# Altium footprint library PCBfly.PcbLib: 32 footprints (part 2 of 2)
Each footprint in its own frame and in the unit in brackets; x right, y up, seen from the top. Pads: shape width x height; smd on the part's side, far side on the other; paste and mask are expansions set on the pad; w line width, h text height; cw(c..) or ccw(c..) is an arc to the next point about the centre after c.
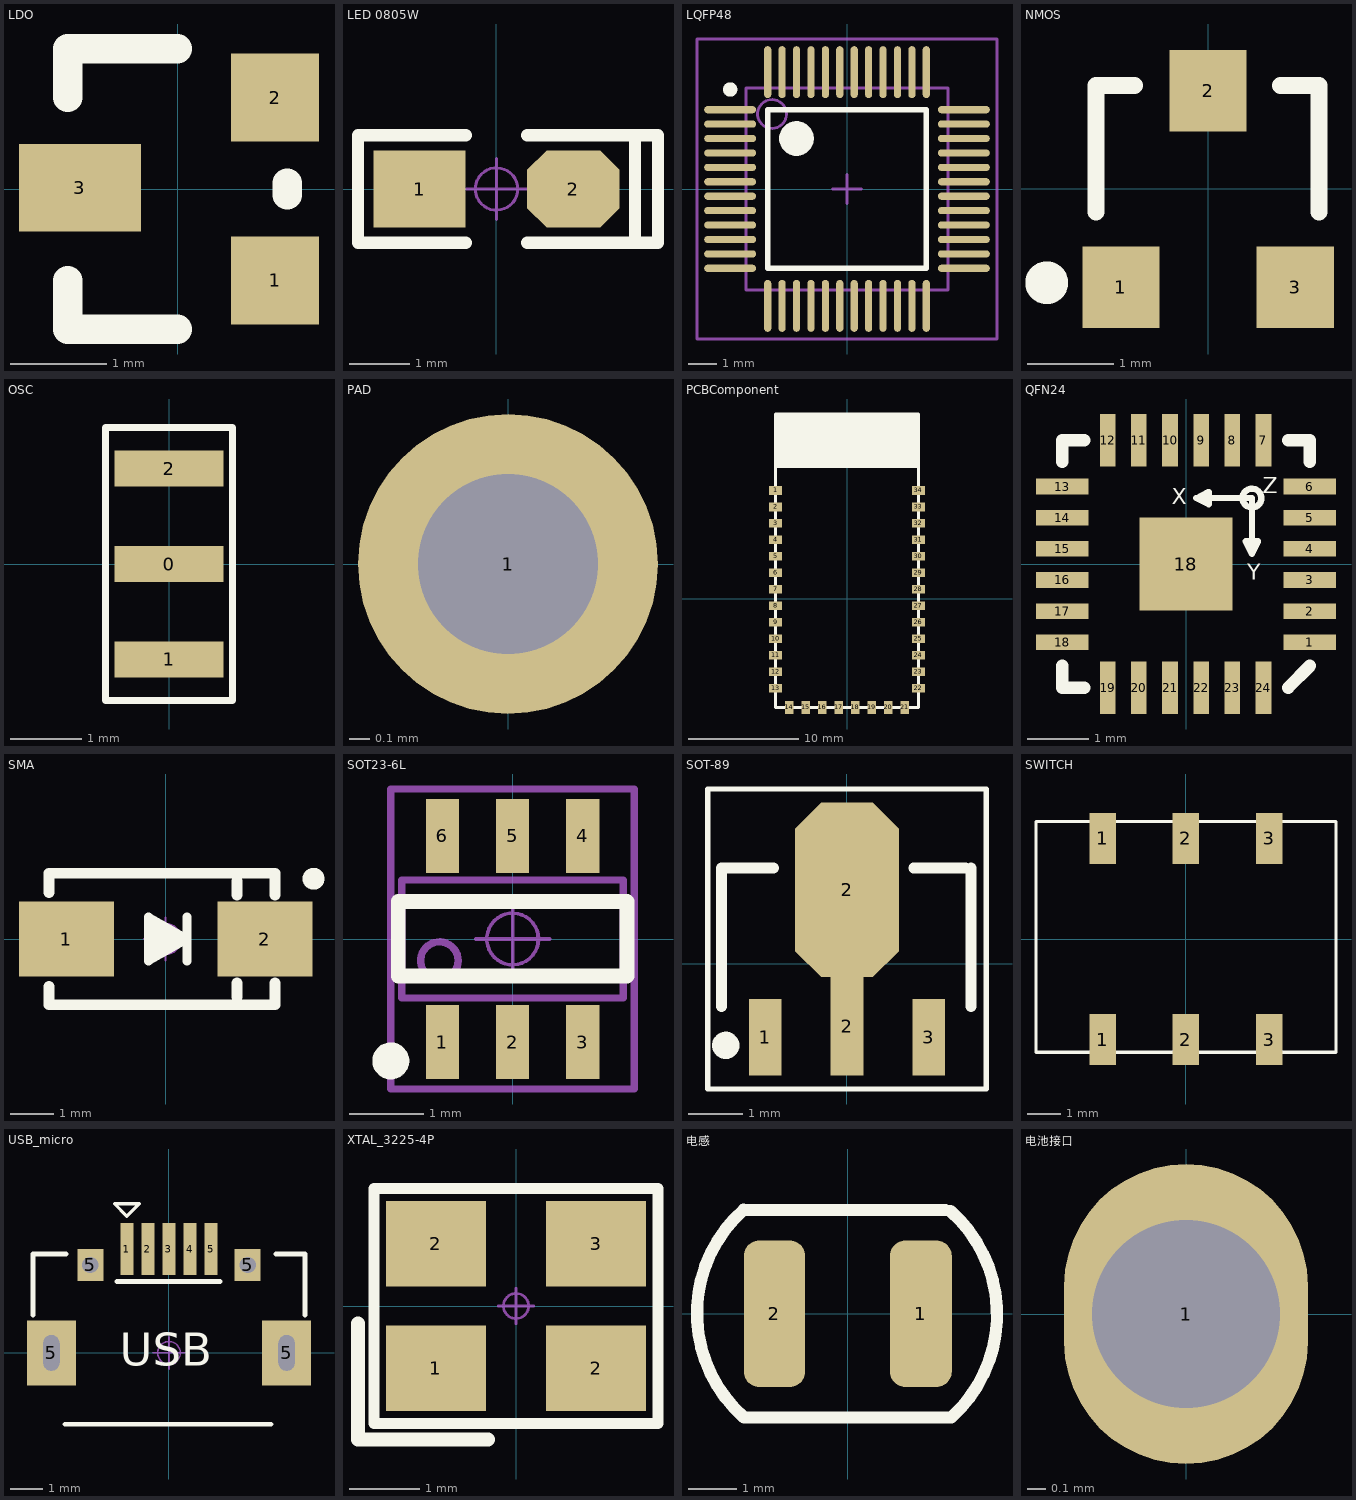
[diagram p1: the footprints below, top view; thin cyan lines are the x and y axes]

## LDO [mil]
pads (3):
  rect 36x36 smd: 1(40,-37.5) 2(40,37.5)
  rect 50x36 smd: 3(-40,0.5)
Top Overlay:
  lines w12: -45,-37.5 -45,-57.5 0,-57.5 ; -45,37.5 -45,57.5 0,57.5 ; 45,-2.5 45,2.5
3D body "sot23-3.STEP": height 39.37, standoff -0.79, extent -44.86,-56.99 52.62,57.97

## LED 0805W [mil] "白色0805LED"
pads (2):
  rect 60x50 smd: 1(-50,0)
  oct 60x50 smd: 2(50,0)
Top Overlay:
  lines w8: -20,-35 -90,-35 -90,35 -20,35 ; 20,-35 105,-35 105,35 20,35 ; 90,-35 90,35
Mechanical 15:
  circle w1.97: c0,0 r13.78
  lines w1.97: -19.68,0 19.68,0 ; 0,-19.68 0,19.68
3D body "LED 0805-W.STEP": height 26.33, standoff -0.16, extent -39.37,-24.65 39.37,24.64
3D body "LED 0805玻璃罩.ST": height 31.69, standoff 12.01, extent -29.49,-24.65 29.49,24.65

## LQFP48 [mm]
pads (48):
  oval 1.8x0.25 smd: 1(-4.05,2.75) 2(-4.05,2.25) 3(-4.05,1.75) 4(-4.05,1.25) 5(-4.05,0.75) 6(-4.05,0.25) 7(-4.05,-0.25) 8(-4.05,-0.75) 9(-4.05,-1.25) 10(-4.05,-1.75) 11(-4.05,-2.25) 12(-4.05,-2.75) 25(4.05,-2.75) 26(4.05,-2.25) 27(4.05,-1.75) 28(4.05,-1.25) 29(4.05,-0.75) 30(4.05,-0.25) 31(4.05,0.25) 32(4.05,0.75) 33(4.05,1.25) 34(4.05,1.75) 35(4.05,2.25) 36(4.05,2.75)
  oval 0.25x1.8 smd: 13(-2.75,-4.05) 14(-2.25,-4.05) 15(-1.75,-4.05) 16(-1.25,-4.05) 17(-0.75,-4.05) 18(-0.25,-4.05) 19(0.25,-4.05) 20(0.75,-4.05) 21(1.25,-4.05) 22(1.75,-4.05) 23(2.25,-4.05) 24(2.75,-4.05) 37(2.75,4.05) 38(2.25,4.05) 39(1.75,4.05) 40(1.25,4.05) 41(0.75,4.05) 42(0.25,4.05) 43(-0.25,4.05) 44(-0.75,4.05) 45(-1.25,4.05) 46(-1.75,4.05) 47(-2.25,4.05) 48(-2.75,4.05)
Top Overlay:
  circle w0.6: c-1.75,1.75 r0.3
  circle w0.25: c-4.05,3.45 r0.125
  lines w0.2: -2.75,-2.75 2.75,-2.75 2.75,2.75 -2.75,2.75 -2.75,-2.75
Mechanical 13:
  circle w0.1: c-2.6,2.6 r0.5
  lines w0.1: -3.5,-3.5 3.5,-3.5 3.5,3.5 -3.5,3.5 -3.5,-3.5
Mechanical 15:
  lines w0.1: -0.5,0 0.5,0 ; 0,-0.5 0,0.5 ; -5.2,-5.2 5.2,-5.2 5.2,5.2 -5.2,5.2 -5.2,-5.2
3D body "LQFP48 7X7.STEP": height 1.45, standoff 0, extent -4.489,-4.505 4.517,4.5

## NMOS [mm]
pads (3):
  rect 0.9x0.95 smd: 1(-1.016,-1.143) 2(0,1.143) 3(1.016,-1.143)
Top Overlay:
  circle w0.25: c-1.882,-1.093 r0.125
  lines w0.2: -1.307,-0.268 -1.307,1.207 -0.857,1.207 ; 0.843,1.207 1.293,1.207 1.293,-0.268
3D body "sot23-3.STEP": height 1, standoff -0.02, extent -1.435,-1.251 1.485,1.225

## OSC [mil]
pads (3):
  rect 60x19.68 smd: 0(0,0) 1(0,-52.5) 2(0,52.5)
Top Overlay:
  lines w3.94: -35,-75 35,-75 35,75 -35,75 -35,-45 -35,-75
3D body "村田8M晶振CSTCE.step": height 27.6, standoff 0, extent -23.75,-65.99 27.43,59.99

## PAD [mm]
pads (1):
  round 1.5 hole 0.9: 1(0,0)

## PCBComponent [mm]
pads (34):
  rect 1.2x0.8 smd: 1(-6.5,9.875) 2(-6.5,8.375) 3(-6.5,6.875) 4(-6.5,5.375) 5(-6.5,3.875) 6(-6.5,2.375) 7(-6.5,0.875) 8(-6.5,-0.625) 9(-6.5,-2.125) 10(-6.5,-3.625) 11(-6.5,-5.125) 12(-6.5,-6.625) 13(-6.5,-8.125) 22(6.5,-8.125) 23(6.5,-6.625) 24(6.5,-5.125) 25(6.5,-3.625) 26(6.5,-2.125) 27(6.5,-0.625) 28(6.5,0.875) 29(6.5,2.375) 30(6.5,3.875) 31(6.5,5.375) 32(6.5,6.875) 33(6.5,8.375) 34(6.5,9.875)
  rect 0.8x1.2 smd: 14(-5.25,-9.875) 15(-3.75,-9.875) 16(-2.25,-9.875) 17(-0.75,-9.875) 18(0.75,-9.875) 19(2.25,-9.875) 20(3.75,-9.875) 21(5.25,-9.875)
Top Overlay:
  rectangle: -6.5,12.025 6.5,16.825
  lines w0.254: -6.5,12.025 6.5,12.025 ; -6.5,-9.875 -6.5,16.825 6.5,16.825 6.5,-9.875 -6.5,-9.875
3D body "User Library-HC05(06).step": height 4.31, standoff 0, extent -6.551,-9.906 6.449,17.094

## QFN24 [mil]
pads (25):
  rect 33.46x10 smd: 1(78.87,-49.87) 2(78.87,-30.03) 3(78.87,-10.19) 4(78.87,9.66) 5(78.87,29.5) 6(78.87,49.34) 13(-78.87,49.34) 14(-78.87,29.5) 15(-78.87,9.66) 16(-78.87,-10.19) 17(-78.87,-30.03) 18(-78.87,-49.87)
  rect 10x33.46 smd: 7(49.34,78.87) 8(29.5,78.87) 9(9.66,78.87) 10(-10.19,78.87) 11(-30.03,78.87) 12(-49.87,78.87) 19(-49.87,-78.87) 20(-30.03,-78.87) 21(-10.19,-78.87) 22(9.66,-78.87) 23(29.5,-78.87) 24(49.34,-78.87)
  rect 59.06x59.06 smd: 18(0,0)
Top Overlay:
  circle w4: c42,42 r6
  lines w4: 6.57,42 42,42 42,6.5 ; 6.57,42 14.44,45.94 14.44,38.06 6.57,42 ; 42,6.5 45.94,14.44 38.06,14.44 42,6.5
  lines w8: -78.87,-64.87 -78.87,-78.87 -64.87,-78.87 ; -78.87,65.09 -78.87,78.87 -64.87,78.87 ; 65.09,-78.87 78.87,-64.87 ; 65.09,78.87 78.87,78.87 78.87,65.09
  text "X" at -9,38 h10.2
  text "Y" at 39,-10 h10.2
  text "Z" at 49,45 h10.2
3D body "QFN24.step": height 35.43, standoff 0, extent -78.82,-78.82 78.82,78.82

## SMA [mm] "4.5x2.6*2.2mm（长宽高，不包括引脚）"
height 2.54
pads (2):
  rect 2.2x1.75 smd: 1(-2.3,0) 2(2.3,0)
Top Overlay:
  circle w0.254: c3.429,1.397 r0.127
  lines w0.203: 0.494,-0.508 0.494,0.508 ; -0.395,-0.508 0.494,0 -0.395,0.508 -0.395,-0.508
  lines w0.254: -2.7,-1.105 -2.7,-1.524 2.54,-1.524 2.54,-1.016 ; -2.7,1.08 -2.7,1.524 2.54,1.524 2.54,1.016 ; -0.33,0.305 0.305,0 -0.254,-0.305 -0.254,0.051 0.023,0 ; 1.651,-1.35 1.651,-1.016 ; 1.651,1.016 1.651,1.35
Mechanical 15:
  circle w0.05: c0,0 r0.35
  lines w0.05: -0.5,0 0.5,0 ; 0,-0.5 0,0.5
3D body "SMA.STEP": height 2.15, standoff 0.04, extent -2.528,-1.3 2.575,1.3

## SOT23-6L [mm] "3x1.6x1.1mm(长宽高)"
height 1.45
pads (6):
  rect 0.45x1 smd: 1(-0.95,-1.397) 2(0,-1.397) 3(0.95,-1.397) 4(0.95,1.397) 5(0,1.397) 6(-0.95,1.397)
Top Overlay:
  circle w0.25: c-1.65,-1.651 r0.125
  lines w0.2: -1.55,-0.5 1.55,-0.5 1.55,0.508 -1.55,0.508 -1.55,-0.5
Mechanical 13:
  circle w0.1: c-0.992,-0.292 r0.254
  lines w0.1: -1.5,-0.8 -1.5,0.8 1.5,0.8 1.5,-0.8 -1.5,-0.8
Mechanical 15:
  circle w0.05: c0,0 r0.35
  lines w0.05: -0.5,0 0.5,0 ; 0,-0.5 0,0.5
  lines w0.1: -1.65,-2.032 -1.65,2.032 1.65,2.032 1.65,-2.032 -1.65,-2.032
3D body "SOT23-6.STEP": height 1.15, standoff -0.03, extent -1.5,-1.404 1.5,1.403

## SOT-89 [mm]
pads (4):
  rect 0.6x1.4 smd: 1(-1.5,-1.35) 3(1.5,-1.35)
  rect 0.6x1.8 smd: 2(0,-1.15)
  oct 1.9x3.2 smd: 2(0,1.35)
Top Overlay:
  circle w0.25: c-2.223,-1.5 r0.125
  lines w0.1: -2.55,-2.3 2.55,-2.3 2.55,3.2 -2.55,3.2 -2.55,-2.3
  lines w0.2: -2.3,-0.786 -2.3,1.75 -1.35,1.75 ; 1.223,1.75 2.173,1.75 ; 2.272,-0.786 2.272,1.75
3D body "SOT-89-3.STEP": height 1.51, standoff 0, extent -2.232,-1.633 2.268,2.667

## SWITCH [mil]
pads (6):
  rect 31.5x60 smd: 1(-98.43,-119) 1(-98.43,119) 2(0,-119) 2(0,119) 3(98.43,-119) 3(98.43,119)
Top Overlay:
  lines w3.94: -177.43,-134 -177.43,139 177.57,139 177.57,-134 -177.43,-134
3D body "User Library-smd_slide_switch.step": height 214.57, standoff 0, extent -177.57,-133.65 178.72,138

## USB_micro [mm] "micro型USB ，5.7*7.8*2.5mm"
pads (9):
  rect 0.4x1.6 smd mask+0.102: 1(-1.3,3.2) 2(-0.65,3.2) 3(0,3.2) 4(0.65,3.2) 5(1.3,3.2)
  rect 1.5x2 hole 0.5 slot 1.1 at 90 deg: 5(-3.625,0) 5(3.625,0)
  rect 0.8x1 hole 0.5: 5(-2.425,2.71) 5(2.425,2.71)
Top Overlay:
  lines w0.1: -1.681,4.597 -1.3,4.216 -0.919,4.597 -1.681,4.597
  lines w0.152: -4.191,1.168 -4.191,3.048 -3.175,3.048 ; -3.2,-2.2 3.15,-2.2 ; -1.6,2.2 1.575,2.2 ; 3.302,3.048 4.191,3.048 4.191,1.168
  text "USB" at -1.524,-0.402 h1.02
Mechanical 15:
  circle w0.05: c0,0 r0.35
  lines w0.05: -0.5,0 0.5,0 ; 0,-0.5 0,0.5
3D body "USB micro_A.STEP": height 2.8, standoff -0.95, extent -4.001,-2.71 4.001,2.89

## XTAL_3225-4P [mil] "3.2*2.5*0.7mm(长宽高)"
pads (4):
  rect 56x48 smd: 1(-45,-35) 2(-45,35) 2(45,-35) 3(45,35)
Top Overlay:
  lines w6: -79.87,-66.08 -79.87,66.09 79.87,66.09 79.87,-66.08 -79.87,-66.08
  lines w8: -88.87,-9.84 -88.87,-75.08 -15.75,-75.08
Mechanical 15:
  circle w1.57: c0,0 r7.07
  circle w14.17: c-45,-35.01 r7.07
  lines w1.57: -10,0 10,0 ; 0,-10 0,10
3D body "OSC 3225-4.STEP": height 27.56, standoff -0.79, extent -62.99,-49.21 62.99,49.21

## 电感 [mil]
pads (2):
  rrect50% 50.74x120.48 smd: 1(60,0)
  rrect50% 50x120.48 smd: 2(-60,0)
Top Overlay:
  lines w10: -85.27,85.31 ccw(c-9.83,0.27) -85,-85 85,-85 ccw(c8.75,-0.69) 84.35,84.21 ; -85,85 80,85
3D body "CD43.STEP": height 129.92, standoff 0, extent -87.28,-77.97 86.72,79.51

## 电池接口 [mm]
pads (1):
  oval 1.3x1.6 hole 1: 1(0,0)